# Altium footprint library MODULE.PcbLib: 35 footprints (part 2 of 3)
Each footprint in its own frame and in the unit in brackets; x right, y up, seen from the top. Pads: shape width x height; smd on the part's side, far side on the other; paste and mask are expansions set on the pad; w line width, h text height; cw(c..) or ccw(c..) is an arc to the next point about the centre after c.
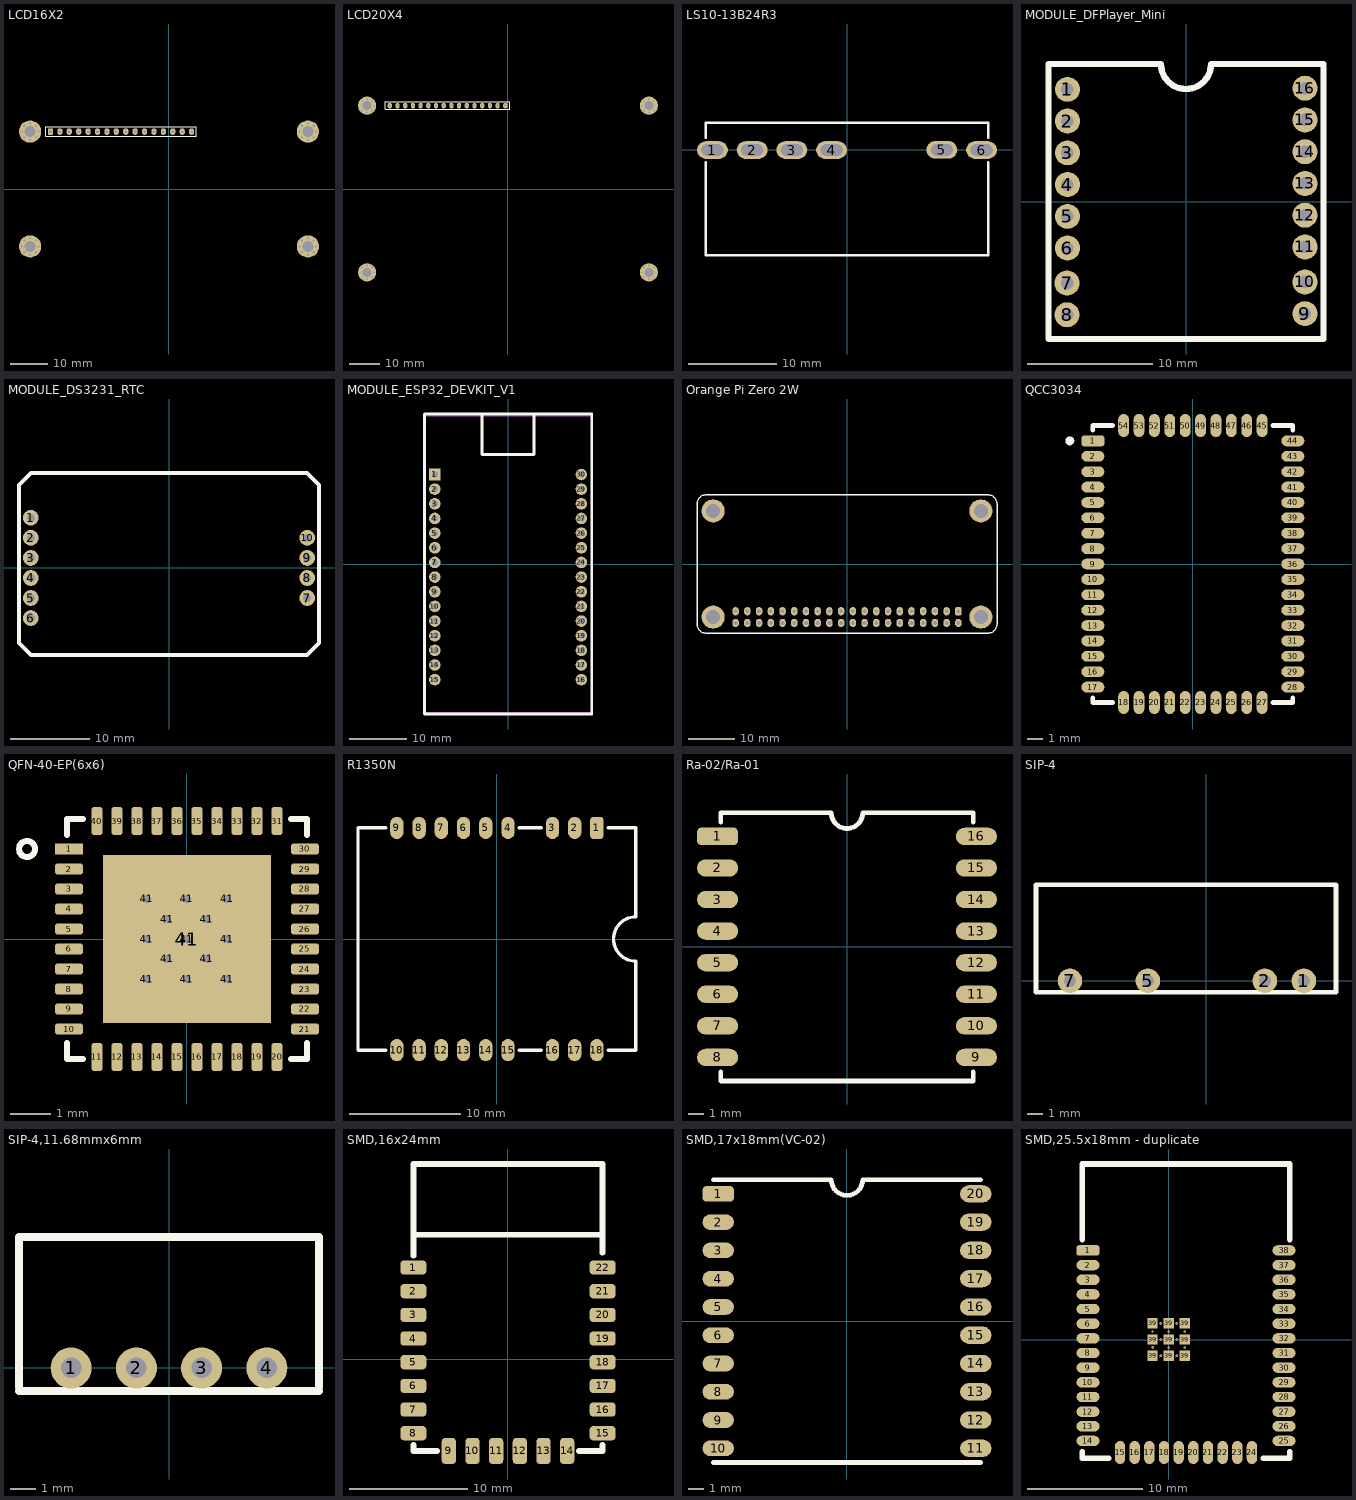
[diagram p1: the footprints below, top view; thin cyan lines are the x and y axes]

## LCD16X2 [mm]
pads (52):
  rrect50% 1.4x1.8 hole 0.7 mask+0.15: 1(-32,15.5)
  oval 1.4x1.8 hole 0.7 mask+0.15: 2(-29.46,15.5) 3(-26.92,15.5) 4(-24.38,15.5) 5(-21.84,15.5) 6(-19.3,15.5) 7(-16.76,15.5) 8(-14.22,15.5) 9(-11.68,15.5) 10(-9.14,15.5) 11(-6.6,15.5) 12(-4.06,15.5) 13(-1.52,15.5) 14(1.02,15.5) 15(3.56,15.5) 16(6.1,15.5)
  round 0.6 hole 0.6 mask+0: ""(-39.75,-15.5) ""(-39.75,15.5) ""(-39.091,-17.091) ""(-39.091,-13.909) ""(-39.091,13.909) ""(-39.091,17.091) ""(-37.5,-17.75) ""(-37.5,-13.25) ""(-37.5,13.25) ""(-37.5,17.75) ""(-35.909,-17.091) ""(-35.909,-13.909) ""(-35.909,13.909) ""(-35.909,17.091) ""(-35.25,-15.5) ""(-35.25,15.5) ""(35.25,-15.5) ""(35.25,15.5) ""(35.909,-17.091) ""(35.909,-13.909) ""(35.909,13.909) ""(35.909,17.091) ""(37.5,-17.75) ""(37.5,-13.25) ""(37.5,13.25) ""(37.5,17.75) ""(39.091,-17.091) ""(39.091,-13.909) ""(39.091,13.909) ""(39.091,17.091) ""(39.75,-15.5) ""(39.75,15.5)
  round 6 hole 3 mask+0.3: ""(-37.5,-15.5) ""(-37.5,15.5) ""(37.5,-15.5) ""(37.5,15.5)
Top Overlay:
  lines w0.3: -33.27,14.25 -33.27,16.75 7.37,16.75 7.37,14.25 -33.27,14.25
3D body "LCD.STEP": height 16.8, standoff -1.5, extent -40,-18 40,18

## LCD20X4 [mm]
pads (52):
  oval 1.4x1.8 hole 0.7 mask+0.15: 1(-39,27.5) 2(-36.46,27.5) 3(-33.92,27.5) 4(-31.38,27.5) 5(-28.84,27.5) 6(-26.3,27.5) 7(-23.76,27.5) 8(-21.22,27.5) 9(-18.68,27.5) 10(-16.14,27.5) 11(-13.6,27.5) 12(-11.06,27.5) 13(-8.52,27.5) 14(-5.98,27.5) 15(-3.44,27.5) 16(-0.9,27.5)
  round 0.6 hole 0.6 mask+0: ""(-48.75,-27.5) ""(-48.75,27.5) ""(-48.091,-29.091) ""(-48.091,-25.909) ""(-48.091,25.909) ""(-48.091,29.091) ""(-46.5,-29.75) ""(-46.5,-25.25) ""(-46.5,25.25) ""(-46.5,29.75) ""(-44.909,-29.091) ""(-44.909,-25.909) ""(-44.909,25.909) ""(-44.909,29.091) ""(-44.25,-27.5) ""(-44.25,27.5) ""(44.25,-27.5) ""(44.25,27.5) ""(44.909,-29.091) ""(44.909,-25.909) ""(44.909,25.909) ""(44.909,29.091) ""(46.5,-29.75) ""(46.5,-25.25) ""(46.5,25.25) ""(46.5,29.75) ""(48.091,-29.091) ""(48.091,-25.909) ""(48.091,25.909) ""(48.091,29.091) ""(48.75,-27.5) ""(48.75,27.5)
  round 6 hole 3 mask+0.3: ""(-46.5,-27.5) ""(-46.5,27.5) ""(46.5,-27.5) ""(46.5,27.5)
Top Overlay:
  lines w0.3: -40.47,26.25 0.57,26.25 0.57,28.75 -40.47,28.75 -40.47,26.25
3D body "QP5522 Jaycar 20x4 LCD Module v14.step": height 13.54, standoff -6, extent -49,-30 49,30

## LS10-13B24R3 [mm]
pads (6):
  oval 3.5x2 hole 1.3 slot 2.5 at 0 deg: 1(-15.25,-0.008) 2(-10.75,-0.008) 3(-6.25,-0.008) 4(-1.75,-0.008) 5(10.75,0.008) 6(15.25,-0.008)
Top Overlay:
  lines w0.3: -16,-1.4 -16,-11.95 16,-11.95 ; -16,1.4 -16,3.1 16,3.1 ; 16,-11.9 16,-1.4 ; 16,1.4 16,3.1 ; 16,3.1 16,3.1
3D body "SMD-6P,32x20x15.05mm.step": height 18, standoff -2, extent -16,-11.95 16,3.1

## MODULE_DFPlayer_Mini [mm]
pads (16):
  round 2 hole 1: 1(-9.481,8.973) 2(-9.481,6.433) 3(-9.481,3.893) 4(-9.481,1.353) 5(-9.481,-1.187) 6(-9.481,-3.727) 7(-9.519,-6.525) 8(-9.519,-9.065) 9(9.519,-8.973) 10(9.519,-6.433) 11(9.519,-3.635) 12(9.519,-1.095) 13(9.519,1.445) 14(9.519,3.985) 15(9.519,6.525) 16(9.519,9.065)
Top Overlay:
  lines w0.5: -11,-11 -11,11 -2,11 ccw(c0,11) 2,11 11,11 11,-11 -11,-11
3D body "DFPlayer Mini Assem v1.step": height 6, standoff -5.2, extent -10.4,-13.06 10.4,10.4

## MODULE_DS3231_RTC [mm]
pads (10):
  round 2 hole 1 mask+0.2: 1(-17.5,6.35) 2(-17.5,3.81) 3(-17.5,1.27) 4(-17.5,-1.27) 5(-17.5,-3.81) 6(-17.5,-6.35) 7(17.5,-3.81) 8(17.5,-1.27) 9(17.5,1.27) 10(17.5,3.81)
Top Overlay:
  lines w0.5: -19,-9.5 -17.5,-11 17.5,-11 19,-9.5 19,10.5 17.5,12 -17.5,12 -19,10.5 -19,-9.5
3D body "User Library-DS3231 Timer Assembly.STEP": height 15, standoff -2.63, extent -19.17,-10.3 19.17,11.5

## MODULE_ESP32_DEVKIT_V1 [mm]
height 6.8
pads (30):
  rect 2x2 hole 1.02: 1(-12.7,15.515)
  round 2 hole 1.02: 2(-12.7,12.975) 3(-12.7,10.435) 4(-12.7,7.895) 5(-12.7,5.355) 6(-12.7,2.815) 7(-12.7,0.275) 8(-12.7,-2.265) 9(-12.7,-4.805) 10(-12.7,-7.345) 11(-12.7,-9.885) 12(-12.7,-12.425) 13(-12.7,-14.965) 14(-12.7,-17.505) 15(-12.7,-20.045) 16(12.7,-20.045) 17(12.7,-17.505) 18(12.7,-14.965) 19(12.7,-12.425) 20(12.7,-9.885) 21(12.7,-7.345) 22(12.7,-4.805) 23(12.7,-2.265) 24(12.7,0.275) 25(12.7,2.815) 26(12.7,5.355) 27(12.7,7.895) 28(12.7,10.435) 29(12.7,12.975) 30(12.7,15.515)
Top Overlay:
  lines w0.5: -4.5,26 -4.5,19 4.5,19 4.5,26 ; -14.5,-26 -14.5,26 14.5,26 14.5,-26 -14.5,-26
Mechanical 15:
  lines w0.05: -14.53,-25.725 14.48,-25.725 14.48,25.725 -14.53,25.725 -14.53,-25.725
3D body "ESP32-DEVKIT-V1--3DModel-STEP-269445.STEP": height 7.05, standoff -6, extent -14.227,-26.027 13.973,26.423

## Orange Pi Zero 2W [mm]
pads (44):
  rrect50% 1.4x1.8 hole 0.8: 1(24.13,-10.23)
  oval 1.4x1.8 hole 0.8: 2(21.59,-10.23) 3(19.05,-10.23) 4(16.51,-10.23) 5(13.97,-10.23) 6(11.43,-10.23) 7(8.89,-10.23) 8(6.35,-10.23) 9(3.81,-10.23) 10(1.27,-10.23) 11(-1.27,-10.23) 12(-3.81,-10.23) 13(-6.35,-10.23) 14(-8.89,-10.23) 15(-11.43,-10.23) 16(-13.97,-10.23) 17(-16.51,-10.23) 18(-19.05,-10.23) 19(-21.59,-10.23) 20(-24.13,-10.23) 21(-24.13,-12.77) 22(-21.59,-12.77) 23(-19.05,-12.77) 24(-16.51,-12.77) 25(-13.97,-12.77) 26(-11.43,-12.77) 27(-8.89,-12.77) 28(-6.35,-12.77) 29(-3.81,-12.77) 30(-1.27,-12.77) 31(1.27,-12.77) 32(3.81,-12.77) 33(6.35,-12.77) 34(8.89,-12.77) 35(11.43,-12.77) 36(13.97,-12.77) 37(16.51,-12.77) 38(19.05,-12.77) 39(21.59,-12.77) 40(24.13,-12.77)
  round 5 hole 3: ""(-29,-11.5) ""(-29,11.5) ""(29,-11.5) ""(29,11.5)
Top Overlay:
  lines w0.3: -32.5,-13 ccw(c-30.5,-13) -30.5,-15 30.5,-15 ccw(c30.5,-13) 32.5,-13 32.5,13 ccw(c30.5,13) 30.5,15 -30.5,15 ccw(c-30.5,13) -32.5,13 -32.5,-13
3D body "PLD40[1].stp": height 5.5, standoff -6.04, extent -25.4,-13.97 25.4,-8.89
3D body "orange_pi_zero2w_details_26_04_2024[1].stp": height 7, standoff 0.25, extent -32.5,-15 32.5,15.85

## QCC3034 [mm]
pads (54):
  rrect50% 1.5x0.7 smd: 1(-6.5,8)
  oval 1.5x0.7 smd: 2(-6.5,7) 3(-6.5,6) 4(-6.5,5) 5(-6.5,4) 6(-6.5,3) 7(-6.5,2) 8(-6.5,1) 9(-6.5,0) 10(-6.5,-1) 11(-6.5,-2) 12(-6.5,-3) 13(-6.5,-4) 14(-6.5,-5) 15(-6.5,-6) 16(-6.5,-7) 17(-6.5,-8) 28(6.5,-8) 29(6.5,-7) 30(6.5,-6) 31(6.5,-5) 32(6.5,-4) 33(6.5,-3) 34(6.5,-2) 35(6.5,-1) 36(6.5,0) 37(6.5,1) 38(6.5,2) 39(6.5,3) 40(6.5,4) 41(6.5,5) 42(6.5,6) 43(6.5,7) 44(6.5,8)
  oval 0.7x1.5 smd: 18(-4.5,-9) 19(-3.5,-9) 20(-2.5,-9) 21(-1.5,-9) 22(-0.5,-9) 23(0.5,-9) 24(1.5,-9) 25(2.5,-9) 26(3.5,-9) 27(4.5,-9) 45(4.5,9) 46(3.5,9) 47(2.5,9) 48(1.5,9) 49(0.5,9) 50(-0.5,9) 51(-1.5,9) 52(-2.5,9) 53(-3.5,9) 54(-4.5,9)
Top Overlay:
  circle w0.3: c-8,8 r0.141
  lines w0.3: -6.5,-8.7 -6.5,-9 -5.2,-9 ; -6.5,8.7 -6.5,9 -5.2,9 ; 5.2,-9 6.5,-9 6.5,-8.7 ; 5.2,9 6.5,9 6.5,8.7

## QFN-40-EP(6x6) [mm]
pads (54):
  rect 0.7x0.28 smd mask+0.15: 1(-2.95,2.25)
  rrect50% 0.7x0.28 smd mask+0.15: 2(-2.95,1.75) 3(-2.95,1.25) 4(-2.95,0.75) 5(-2.95,0.25) 6(-2.95,-0.25) 7(-2.95,-0.75) 8(-2.95,-1.25) 9(-2.95,-1.75) 10(-2.95,-2.25) 21(2.95,-2.25) 22(2.95,-1.75) 23(2.95,-1.25) 24(2.95,-0.75) 25(2.95,-0.25) 26(2.95,0.25) 27(2.95,0.75) 28(2.95,1.25) 29(2.95,1.75) 30(2.95,2.25)
  rrect50% 0.28x0.7 smd mask+0.15: 11(-2.25,-2.95) 12(-1.75,-2.95) 13(-1.25,-2.95) 14(-0.75,-2.95) 15(-0.25,-2.95) 16(0.25,-2.95) 17(0.75,-2.95) 18(1.25,-2.95) 19(1.75,-2.95) 20(2.25,-2.95) 31(2.25,2.95) 32(1.75,2.95) 33(1.25,2.95) 34(0.75,2.95) 35(0.25,2.95) 36(-0.25,2.95) 37(-0.75,2.95) 38(-1.25,2.95) 39(-1.75,2.95) 40(-2.25,2.95)
  round 0.4 hole 0.2: 41(-1,-1) 41(-1,0) 41(-1,1) 41(-0.5,-0.5) 41(-0.5,0.5) 41(0,-1) 41(0,0) 41(0,1) 41(0.5,-0.5) 41(0.5,0.5) 41(1,-1) 41(1,0) 41(1,1)
  rect 4.2x4.2 smd mask+0.15: 41(0,0)
Top Overlay:
  circle w0.15: c-4,2.25 r0.2
  lines w0.15: -3,-2.6 -3,-3 -2.6,-3 ; -3,2.6 -3,3 -2.6,3 ; 2.6,-3 3,-3 3,-2.6 ; 2.6,3 3,3 3,2.6
3D body "QFN-40 (6x6x0.9).step": height 0.92, standoff 0, extent -3,-3 3,3

## R1350N [mm]
pads (18):
  rrect50% 1.2x2 smd: 1(9,10)
  oval 1.2x2 smd: 2(7,10) 3(5,10) 4(1,10) 5(-1,10) 6(-3,10) 7(-5,10) 8(-7,10) 9(-9,10) 10(-9,-10) 11(-7,-10) 12(-5,-10) 13(-3,-10) 14(-1,-10) 15(1,-10) 16(5,-10) 17(7,-10) 18(9,-10)
Top Overlay:
  lines w0.3: -10,-10 -12.5,-10 -12.5,10 -10,10 ; 2,-10 4,-10 ; 2,10 4,10 ; 10,-10 12.5,-10 12.5,-2 cw(c12.5,0) 12.5,2 12.5,10 10,10

## Ra-02/Ra-01 [mm]
pads (16):
  rrect50% 2.6x1.1 smd: 1(-8.2,7)
  oval 2.6x1.1 smd: 2(-8.2,5) 3(-8.2,3) 4(-8.2,1) 5(-8.2,-1) 6(-8.2,-3) 7(-8.2,-5) 8(-8.2,-7) 9(8.2,-7) 10(8.2,-5) 11(8.2,-3) 12(8.2,-1) 13(8.2,1) 14(8.2,3) 15(8.2,5) 16(8.2,7)
Top Overlay:
  lines w0.3: -8,-7.9 -8,-8.5 8,-8.5 8,-7.9 ; -8,7.9 -8,8.5 -1,8.5 ccw(c0,8.5) 1,8.5 8,8.5 8,7.9
3D body "User Library-RA-02-2.STEP": height 3.2, standoff 0, extent -8,-8.5 8,8.5

## SIP-4 [mm]
pads (4):
  round 1.6 hole 0.8 mask+0.2: 1(6.35,0) 2(3.81,0) 5(-3.81,0) 7(-8.89,0)
Top Overlay:
  lines w0.3: -11.1,-0.75 -11.1,6.25 8.44,6.25 8.44,-0.75 -11.1,-0.75
3D body "B0505S-2W.stp": height 10.2, standoff -4, extent -11.07,-0.7 8.53,6.3

## SIP-4,11.68mmx6mm [mm]
pads (4):
  round 1.6 hole 0.8 mask+0.2: 1(-3.81,0) 2(-1.27,0) 3(1.27,0) 4(3.81,0)
Top Overlay:
  lines w0.3: -5.84,-0.9 5.84,-0.9 ; -5.84,-0.75 -5.84,5.1 5.84,5.1 5.84,-0.75
3D body "DC-DC_B5050S-1W.stp": height 10.16, standoff -4.1, extent -5.8,-0.9 5.8,5.1

## SMD,16x24mm [mm]
pads (22):
  rrect50% 2.2x1.2 smd: 1(-8,7.75) 2(-8,5.75) 3(-8,3.75) 4(-8,1.75) 5(-8,-0.25) 6(-8,-2.25) 7(-8,-4.25) 8(-8,-6.25) 15(8,-6.25) 16(8,-4.25) 17(8,-2.25) 18(8,-0.25) 19(8,1.75) 20(8,3.75) 21(8,5.75) 22(8,7.75)
  rrect50% 1.2x2.2 smd: 9(-5,-7.75) 10(-3,-7.75) 11(-1,-7.75) 12(1,-7.75) 13(3,-7.75) 14(5,-7.75)
Top Overlay:
  lines w0.5: -8,-7.25 -8,-7.75 -6,-7.75 ; -8,8.75 -8,16.5 8,16.5 8,9 ; -8,10.521 7.824,10.521 ; 6,-7.75 8,-7.75 8,-7.25
3D body "ESP-12F.STEP": height 3.17, standoff 0, extent -8,-7.8 8,16.2

## SMD,17x18mm(VC-02) [mm]
pads (20):
  rrect50% 2x1 smd: 1(-8.2,8.1)
  oval 2x1 smd: 2(-8.2,6.3) 3(-8.2,4.5) 4(-8.2,2.7) 5(-8.2,0.9) 6(-8.2,-0.9) 7(-8.2,-2.7) 8(-8.2,-4.5) 9(-8.2,-6.3) 10(-8.2,-8.1)
  oval 2x1.1 smd: 11(8.2,-8.1) 12(8.2,-6.3) 13(8.2,-4.5) 14(8.2,-2.7) 15(8.2,-0.9) 16(8.2,0.9) 17(8.2,2.7) 18(8.2,4.5) 19(8.2,6.3) 20(8.2,8.1)
Top Overlay:
  lines w0.3: -8.5,-9 8.5,-9 ; -8.5,9 -1,9 ccw(c0,9) 1,9 8.5,9
3D body "VC-02--3DModel-STEP-510211.STEP": height 3.4, standoff 0, extent -8.5,-9 8.5,9

## SMD,25.5x18mm - duplicate [mm]
pads (47):
  rrect50% 2x0.9 smd mask+0.1: 1(-7,7.72)
  oval 2x0.9 smd mask+0.1: 2(-7,6.45) 3(-7,5.18) 4(-7,3.91) 5(-7,2.64) 6(-7,1.37) 7(-7,0.1) 8(-7,-1.17) 9(-7,-2.44) 10(-7,-3.71) 11(-7,-4.98) 12(-7,-6.25) 13(-7,-7.52) 14(-7,-8.79) 25(10,-8.79) 26(10,-7.52) 27(10,-6.25) 28(10,-4.98) 29(10,-3.71) 30(10,-2.44) 31(10,-1.17) 32(10,0.1) 33(10,1.37) 34(10,2.64) 35(10,3.91) 36(10,5.18) 37(10,6.45) 38(10,7.72)
  oval 0.9x2 smd mask+0.1: 15(-4.215,-9.79) 16(-2.945,-9.79) 17(-1.675,-9.79) 18(-0.405,-9.79) 19(0.865,-9.79) 20(2.135,-9.79) 21(3.405,-9.79) 22(4.675,-9.79) 23(5.945,-9.79) 24(7.215,-9.79)
  rect 0.9x0.9 smd mask+0.1: 39(-1.4,-1.4) 39(-1.4,0) 39(-1.4,1.4) 39(0,-1.4) 39(0,0) 39(0,1.4) 39(1.4,-1.4) 39(1.4,0) 39(1.4,1.4)
via -1.4,0.7 diameter 0.2 hole 0.2
via -0.7,-1.4 diameter 0.2 hole 0.2
via 0,0.7 diameter 0.2 hole 0.2
via 0.7,0 diameter 0.2 hole 0.2
via -0.7,0 diameter 0.2 hole 0.2
via 1.4,0.7 diameter 0.2 hole 0.2
via 1.4,-0.7 diameter 0.2 hole 0.2
via 0,-0.7 diameter 0.2 hole 0.2
via -1.374,-0.681 diameter 0.2 hole 0.2
via 0.7,-1.4 diameter 0.2 hole 0.2
via 0.7,1.4 diameter 0.2 hole 0.2
via -0.7,1.4 diameter 0.2 hole 0.2
Top Overlay:
  lines w0.5: -7.5,-9.735 -7.5,-10.29 -5.2,-10.29 ; -7.5,8.665 -7.5,15.21 10.5,15.21 10.5,8.665 ; 8.2,-10.29 10.5,-10.29 10.5,-9.735
3D body "ESP32-WROOM-32 v1.step": height 3.9, standoff 0, extent -7.5,-10.29 10.5,15.21